# Altium footprint library 电容.PcbLib: 62 footprints (part 1 of 4)
Each footprint in its own frame and in the unit in brackets; x right, y up, seen from the top. Pads: shape width x height; smd on the part's side, far side on the other; paste and mask are expansions set on the pad; w line width, h text height; cw(c..) or ccw(c..) is an arc to the next point about the centre after c.
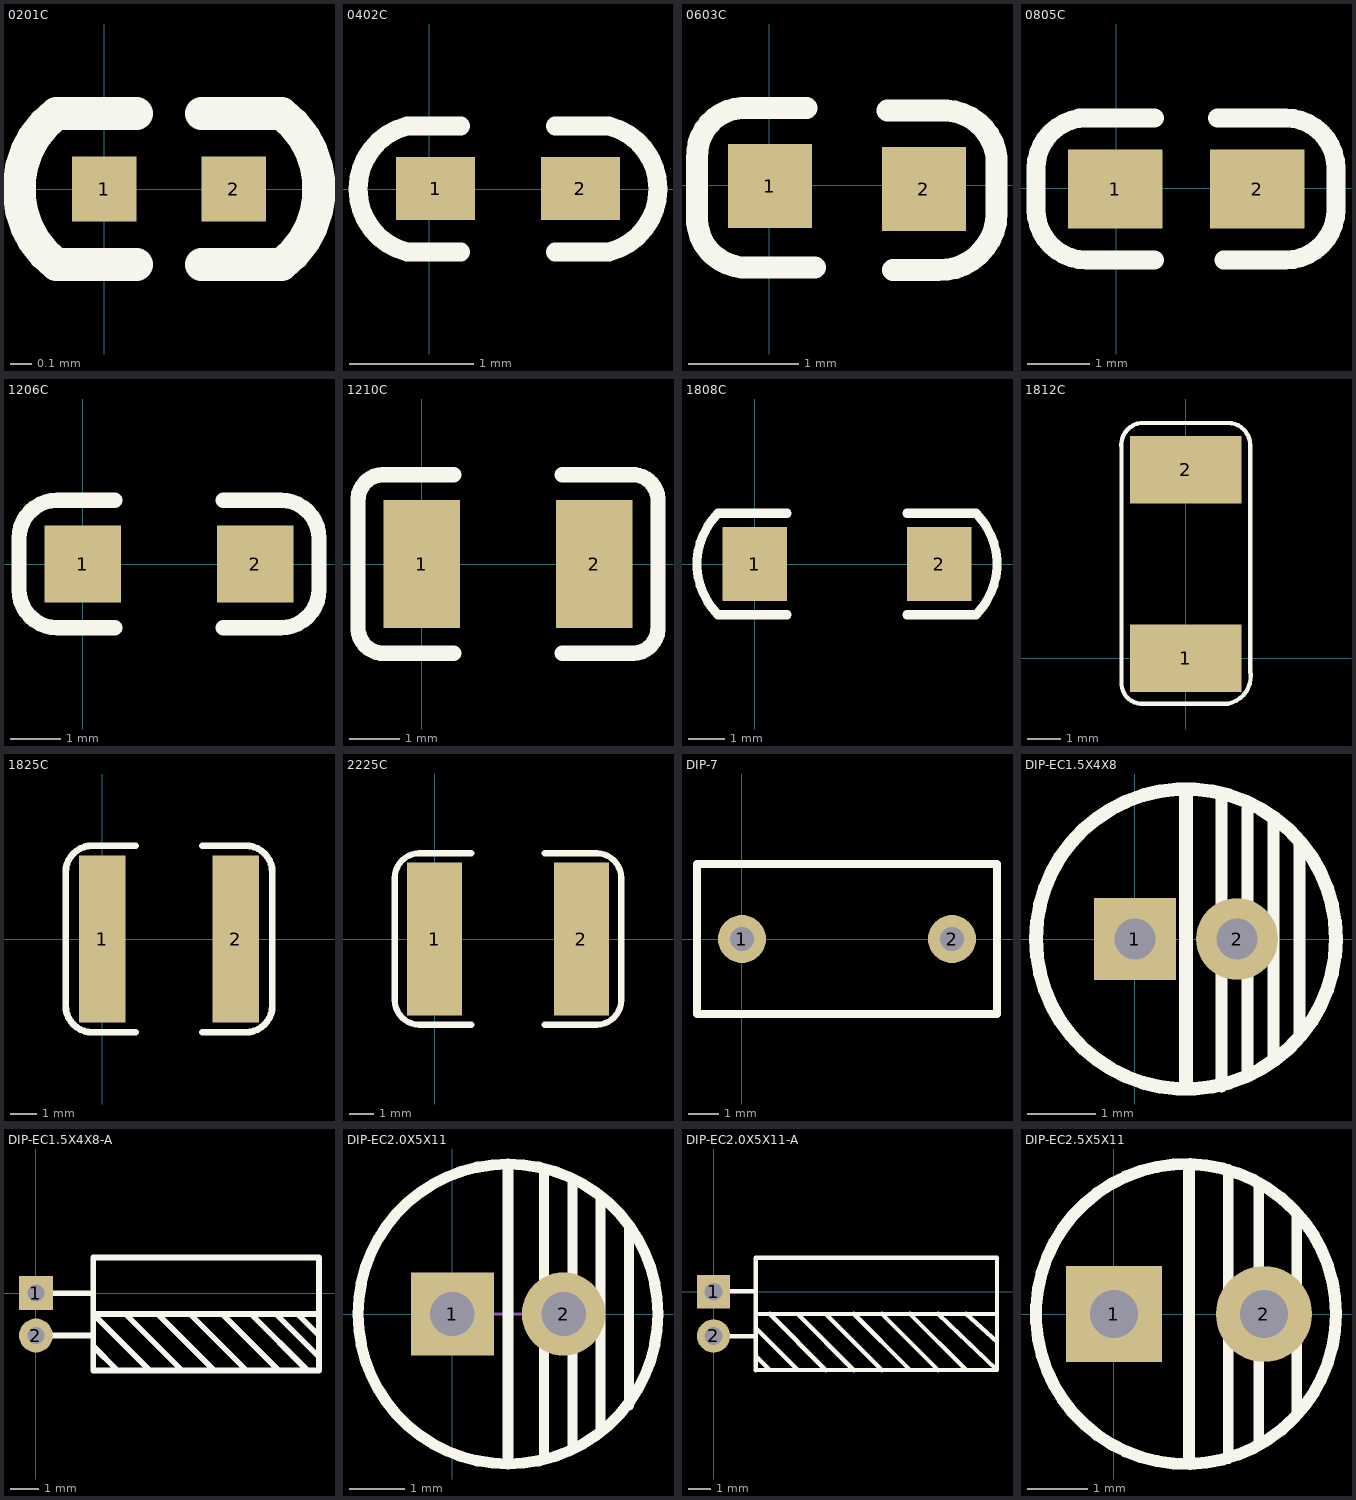
[diagram p0: the footprints below, top view; thin cyan lines are the x and y axes]

## 0201C [mm]
pads (2):
  rect 0.3x0.3 smd: 1(0,0) 2(0.6,0)
Top Overlay:
  lines w0.152: 0.15,-0.35 -0.223,-0.35 cw(c0.046,0) -0.223,0.35 0.15,0.35 ; 0.45,-0.35 0.823,-0.35 ccw(c0.554,0) 0.823,0.35 0.45,0.35
3D body "0201C.STEP": height 0.31, standoff 0, extent 0,-0.152 0.61,0.153

## 0402C [mil]
pads (2):
  rect 25x20 smd: 1(2,0.16) 2(48,0.16)
Top Overlay:
  lines w6: 10,-20 -7,-20 cw(c-2,0) -7,20.01 10,20 ; 40,-20 57,-20 ccw(c52,0) 57,20.01 40,20
3D body "0402C.STEP": height 7.95, standoff 0, extent 5.32,-11.81 44.69,11.82

## 0603C [mil]
pads (2):
  rect 30x30 smd: 1(0.21,-0.35) 2(55.21,-1.35)
Top Overlay:
  lines w7.87: 13.21,27.65 -9.79,27.65 ccw(c-8.79,10.65) -25.79,9.65 -25.79,-10.35 ccw(c-8.29,-11.85) -9.79,-29.35 16.21,-29.35 ; 42.21,26.65 60.21,26.65 cw(c62.21,7.65) 81.21,9.65 81.21,-10.35 cw(c60.71,-9.85) 60.21,-30.35 44.21,-30.35
3D body "0603 SMD Capacitor.STEP": height 11.89, standoff 0, extent -1.49,-14.99 61.5,16.5

## 0805C [mil]
pads (2):
  rect 60x50 smd: 1(-0.71,-0.4) 2(89.29,-0.4)
Top Overlay:
  lines w12: -50.85,-13.26 ccw(c-18.71,-13.26) -18.71,-45.4 24.29,-45.4 ; -50.85,-12.26 -50.85,12.6 cw(c-18.71,12.6) -18.71,44.74 ; -23.71,44.6 24.29,44.6 ; 64.29,44.6 107.29,44.6 ; 68.15,-45.4 107.15,-45.4 ccw(c107.15,-13.26) 139.29,-13.26 139.29,11.6 ; 107.15,44.74 cw(c107.15,12.6) 139.29,12.6
3D body "0805 SMD Capacitor.STEP": height 30.79, standoff 0, extent 5.64,-24.6 84.37,24.61

## 1206C [mil]
pads (2):
  rect 60x60 smd: 1(0,0) 2(135,0)
Top Overlay:
  lines w12: 25,-50 -20,-50 cw(c-20,-20) -50,-20 -50,20 cw(c-20,20) -20,50 25,50 ; 110,-50 155,-50 ccw(c155,-20) 185,-20 185,20 ccw(c155,20) 155,50 ; 155,50 110,50 155,50
3D body "1206 SMD Capacitor.STEP": height 39.45, standoff 0, extent 2.01,-31.49 128,31.5

## 1210C [mil]
pads (2):
  rect 60x100 smd: 1(0,0) 2(135,0)
Top Overlay:
  lines w12: -28.95,-69.97 cw(c-30,-50) -49.97,-51.05 -49.97,48.95 cw(c-30,50) -31.05,69.97 24.97,69.97 ; -28.92,-70 25,-70 ; 110,-70 166.02,-70 ; 110,70 163.92,70 ; 163.95,69.97 cw(c165,50) 184.97,51.05 184.97,-48.95 cw(c165,-50) 166.05,-69.97
3D body "1210 SMD Capacitor.STEP": height 67.1, standoff 0, extent -8.75,-49 148.75,49

## 1808C [mil]
pads (2):
  rect 70x80 smd: 1(0,0) 2(200,0)
Top Overlay:
  lines w9.84: -40,-55 cw(c15,0) -40,55 ; 240,-55 ccw(c185,0) 240,55
  lines w10: -40,-55 35,-55 ; -40,55 35,55 ; 165,-55 240,-55 ; 165,55 240,55
3D body "1808C.STEP": height 80.1, standoff 0, extent -7.5,-40 217.5,40

## 1812C [mm]
pads (2):
  rect 3.302x2 smd: 1(0,0) 2(0,5.572)
Top Overlay:
  lines w0.127: -1.905,6.198 cw(c-1.245,6.299) -1.346,6.96 1.245,6.96 cw(c1.245,6.299) 1.905,6.299 1.905,-0.381 cw(c1.092,-0.533) 1.245,-1.346 -1.346,-1.346 cw(c-1.295,-0.737) -1.905,-0.686 -1.905,6.401
3D body "1812 SMD Capacitor.STEP": height 1.6, standoff 0, extent -1.6,0.544 1.6,5.044

## 1825C [mil]
pads (2):
  rect 70x250 smd: 1(0,0) 2(200,0)
Top Overlay:
  lines w10: 50,-140 -15,-140 cw(c-15,-100) -55,-100 -55,100 cw(c-15,100) -15,140 50,140 ; 150,-140 215,-140 ccw(c215,-100) 255,-100 255,100 ccw(c215,100) 215,140 150,140
3D body "1825C.STEP": height 100.1, standoff 0, extent -10.62,-125.99 210.63,126.01

## 2225C [mil]
pads (2):
  rect 90x250 smd: 1(0,0) 2(240,0)
Top Overlay:
  lines w10: 60,-140 -25,-140 cw(c-25,-100) -65,-100 -65,100 cw(c-25,100) -25,140 60,140 ; 180,-140 265,-140 ccw(c265,-100) 305,-100 305,100 ccw(c265,100) 265,140 180,140
3D body "2225C.STEP": height 70.87, standoff 0, extent 7.8,-124.99 232.21,125

## DIP-7 [mm]
pads (2):
  round 1.6 hole 0.8: 1(0,0) 2(7,0)
Top Overlay:
  lines w0.254: -1.5,-2.5 8.5,-2.5 8.5,2.5 -1.5,2.5 -1.5,-2.5

## DIP-EC1.5X4X8 [mm]
pads (2):
  rect 1.2x1.2 hole 0.6: 1(0,0)
  round 1.2 hole 0.6: 2(1.5,0)
Top Overlay:
  circle w0.2: c0.75,0 r2.2
  lines w0.178: 1.27,-2.159 1.27,2.032 ; 1.651,-1.905 1.651,1.905 ; 2.032,-1.778 2.032,1.778 ; 2.413,-1.397 2.413,1.397
  lines w0.2: 0.75,-2.159 0.75,-2 0.75,2.159
3D body "CAP 1.5X4X8.STEP": height 8.04, standoff -3.46, extent -1.26,-1.966 2.76,2.032

## DIP-EC1.5X4X8-A [mm]
pads (2):
  rect 1.2x1.2 hole 0.6: 1(0,0)
  round 1.2 hole 0.6: 2(0,-1.5)
Top Overlay:
  lines w0.2: 0,-1.5 2,-1.5 ; 0,0 2,0 ; 2.032,-1.881 2.889,-2.738 2.921,-2.738 ; 2.921,-1.627 2.032,-0.738 ; 3.175,-0.738 5.175,-2.738 5.207,-2.738 ; 4.064,-2.738 4.032,-2.738 2.032,-0.738 ; 4.318,-0.738 6.318,-2.738 6.35,-2.738 ; 5.461,-0.738 7.461,-2.738 7.493,-2.738 ; 6.604,-0.738 8.604,-2.738 8.636,-2.738 ; 7.62,-0.738 9.597,-2.715 ccw(c9.652,-2.661) 9.652,-2.738 ; 8.509,-0.738 10.031,-2.26 cw(c10.03,-2.262) 10.032,-2.262 ; 9.271,-0.738 10.031,-1.498 cw(c10.03,-1.5) 10.032,-1.5 ; 10.032,-0.738 2.032,-0.738 ; 2.032,-2.738 10.032,-2.738 10.032,1.262 2.032,1.262 2.032,-2.738
3D body "CAP 1.5X4X8-H.STEP": height 4.02, standoff -3.48, extent -0.254,-2.772 9.996,1.248

## DIP-EC2.0X5X11 [mm]
pads (2):
  rect 1.5x1.5 hole 0.8: 1(0,0)
  round 1.5 hole 0.8: 2(2,0)
Top Overlay:
  circle w0.2: c1,0 r2.7
  lines w0.178: 1.651,-2.54 1.651,2.54 ; 2.159,-2.413 2.159,2.413 ; 2.667,-2.032 2.667,2.032 ; 3.175,-1.651 3.175,1.524
  lines w0.2: 1,-2.667 1,-2 1,2.667
Mechanical 15:
  lines w0.05: 0.5,0 1.5,0
3D body "CAP 2.0X5X11.STEP": height 11.04, standoff -3.42, extent -1.524,-2.5 3.486,2.5

## DIP-EC2.0X5X11-A [mm]
pads (2):
  rect 1.5x1.5 hole 0.8: 1(0,0)
  round 1.5 hole 0.8: 2(0,-2)
Top Overlay:
  lines w0.2: 0.762,-2.016 1.905,-2.016 ; 0.762,0.016 1.905,0.016 ; 1.905,-2.905 2.54,-3.54 ; 1.905,-1.635 3.81,-3.54 ; 1.905,-1.006 12.827,-1 ; 2.54,-1 5.08,-3.548 ; 3.81,-1.005 6.35,-3.547 ; 5.08,-1.004 7.62,-3.545 ; 6.35,-1 8.89,-3.54 ; 7.62,-1.003 10.16,-3.543 ; 8.89,-1.002 11.43,-3.541 ; 10.16,-1.001 12.827,-3.54 ; 11.43,-1.001 12.827,-2.27 ; 12.827,-3.54 1.905,-3.552 1.905,1.54 12.827,1.54 12.827,-3.54
3D body "CAP 2.0X5X11-H.STEP": height 5.02, standoff -3.48, extent -0.254,-3.521 12.956,1.489

## DIP-EC2.5X5X11 [mm]
pads (2):
  rect 1.6x1.6 hole 0.8: 1(0,0)
  round 1.6 hole 0.8: 2(2.5,0)
Top Overlay:
  circle w0.2: c1.2,0 r2.5
  lines w0.178: 1.905,-2.413 1.905,2.413 ; 2.413,-2.159 2.413,2.159 ; 3.048,-1.651 3.048,1.651
  lines w0.2: 1.25,-2.489 1.25,2.413
3D body "CAP 2.5X5X11.STEP": height 11.03, standoff -3.43, extent -1.255,-2.586 3.755,2.413